# Altium schematic symbol library jlcpcb_2025_04_capacitors_extended_0805.schlib: 3281 symbols (part 6 of 18) (continued)
## C0805N121J251T
designator C?  Capacitance: 120pF  (hidden comment: *)
Capacitor, Ceramic (MLCC), 120pF, ±5%, 250V, NP0, ±5%, SMD 0805; Manufacturer: IHHEC(HOLY STONE ENTERPRISE CO., LTD); Manufacturer Part Number: C0805N121J251T; Package Size: 0805; JLCPCB Basic Part: No; JLCPCB Part Number: C105919; Supplier 1: LCSC; Category: Capacitors - MLCC; Supplier Part Number 1: C105919; Tolerance: ±5%; Voltage Rating: 250V; Temperature Coefficient: NP0; RoHS: Yes; ComponentLink1Description: Datasheet; ComponentLink1URL: https://wmsc.lcsc.com/wmsc/upload/file/pdf/v2/lcsc/2304140030_IHHEC-HOLY-STONE-ENTERPRISE-CO---LTD-C0805N121J251T_C105919.pdf; ComponentLink2Description: JLCPCB Part URL; ComponentLink2URL: https://jlcpcb.com/partdetail/C105919; ComponentLink3Description: LCSC Part URL; ComponentLink3URL: https://lcsc.com/product-detail/Multilayer-Ceramic-Capacitors-MLCC---SMD-SMT_IHHECHOLY-STONE-ENTERPRISE-CO.%2C-LTD-IHHECHOLY-STONE-ENTERPRISE-CO.%2C-LTD-C0805N121J251T_C105919.html
footprint CAP-0805 (0805 (2012M) Capacitor)
pins: 1, 2

## C0805N122J050T
designator C?  Capacitance: 1.2nF  (hidden comment: *)
Capacitor, Ceramic (MLCC), 1.2nF, ±5%, 50V, NP0, ±5%, SMD 0805; Manufacturer: IHHEC(HOLY STONE ENTERPRISE CO., LTD); Manufacturer Part Number: C0805N122J050T; Package Size: 0805; JLCPCB Basic Part: No; JLCPCB Part Number: C105920; Supplier 1: LCSC; Category: Capacitors - MLCC; Supplier Part Number 1: C105920; Tolerance: ±5%; Voltage Rating: 50V; Temperature Coefficient: NP0; RoHS: Yes; ComponentLink1Description: Datasheet; ComponentLink1URL: https://wmsc.lcsc.com/wmsc/upload/file/pdf/v2/lcsc/2304140030_IHHEC-HOLY-STONE-ENTERPRISE-CO---LTD-C0805N122J050T_C105920.pdf; ComponentLink2Description: JLCPCB Part URL; ComponentLink2URL: https://jlcpcb.com/partdetail/C105920; ComponentLink3Description: LCSC Part URL; ComponentLink3URL: https://lcsc.com/product-detail/Multilayer-Ceramic-Capacitors-MLCC---SMD-SMT_IHHECHOLY-STONE-ENTERPRISE-CO.%2C-LTD-IHHECHOLY-STONE-ENTERPRISE-CO.%2C-LTD-C0805N122J050T_C105920.html
footprint CAP-0805 (0805 (2012M) Capacitor)
pins: 1, 2

## C0805N151J101T
designator C?  Capacitance: 150pF  (hidden comment: *)
Capacitor, Ceramic (MLCC), 150pF, ±5%, 100V, NP0, ±5%, SMD 0805; Manufacturer: IHHEC(HOLY STONE ENTERPRISE CO., LTD); Manufacturer Part Number: C0805N151J101T; Package Size: 0805; JLCPCB Basic Part: No; JLCPCB Part Number: C105921; Supplier 1: LCSC; Category: Capacitors - MLCC; Supplier Part Number 1: C105921; Tolerance: ±5%; Voltage Rating: 100V; Temperature Coefficient: NP0; RoHS: Yes; ComponentLink1Description: Datasheet; ComponentLink1URL: https://wmsc.lcsc.com/wmsc/upload/file/pdf/v2/lcsc/2304140030_IHHEC-HOLY-STONE-ENTERPRISE-CO---LTD-C0805N151J101T_C105921.pdf; ComponentLink2Description: JLCPCB Part URL; ComponentLink2URL: https://jlcpcb.com/partdetail/C105921; ComponentLink3Description: LCSC Part URL; ComponentLink3URL: https://lcsc.com/product-detail/Multilayer-Ceramic-Capacitors-MLCC---SMD-SMT_IHHECHOLY-STONE-ENTERPRISE-CO.%2C-LTD-IHHECHOLY-STONE-ENTERPRISE-CO.%2C-LTD-C0805N151J101T_C105921.html
footprint CAP-0805 (0805 (2012M) Capacitor)
pins: 1, 2

## C0805N152J050T
designator C?  Capacitance: 1.5nF  (hidden comment: *)
Capacitor, Ceramic (MLCC), 1.5nF, ±5%, 50V, NP0, ±5%, SMD 0805; Manufacturer: IHHEC(HOLY STONE ENTERPRISE CO., LTD); Manufacturer Part Number: C0805N152J050T; Package Size: 0805; JLCPCB Basic Part: No; JLCPCB Part Number: C105922; Supplier 1: LCSC; Category: Capacitors - MLCC; Supplier Part Number 1: C105922; Tolerance: ±5%; Voltage Rating: 50V; Temperature Coefficient: NP0; RoHS: Yes; ComponentLink1Description: Datasheet; ComponentLink1URL: https://wmsc.lcsc.com/wmsc/upload/file/pdf/v2/lcsc/2304140030_IHHEC-HOLY-STONE-ENTERPRISE-CO---LTD-C0805N152J050T_C105922.pdf; ComponentLink2Description: JLCPCB Part URL; ComponentLink2URL: https://jlcpcb.com/partdetail/C105922; ComponentLink3Description: LCSC Part URL; ComponentLink3URL: https://lcsc.com/product-detail/Multilayer-Ceramic-Capacitors-MLCC---SMD-SMT_IHHECHOLY-STONE-ENTERPRISE-CO.%2C-LTD-IHHECHOLY-STONE-ENTERPRISE-CO.%2C-LTD-C0805N152J050T_C105922.html
footprint CAP-0805 (0805 (2012M) Capacitor)
pins: 1, 2

## C0805N182J050T
designator C?  Capacitance: 1.8nF  (hidden comment: *)
Capacitor, Ceramic (MLCC), 1.8nF, ±5%, 50V, NP0, ±5%, SMD 0805; Manufacturer: IHHEC(HOLY STONE ENTERPRISE CO., LTD); Manufacturer Part Number: C0805N182J050T; Package Size: 0805; JLCPCB Basic Part: No; JLCPCB Part Number: C105923; Supplier 1: LCSC; Category: Capacitors - MLCC; Supplier Part Number 1: C105923; Tolerance: ±5%; Voltage Rating: 50V; Temperature Coefficient: NP0; RoHS: Yes; ComponentLink1Description: Datasheet; ComponentLink1URL: https://wmsc.lcsc.com/wmsc/upload/file/pdf/v2/lcsc/2304140030_IHHEC-HOLY-STONE-ENTERPRISE-CO---LTD-C0805N182J050T_C105923.pdf; ComponentLink2Description: JLCPCB Part URL; ComponentLink2URL: https://jlcpcb.com/partdetail/C105923; ComponentLink3Description: LCSC Part URL; ComponentLink3URL: https://lcsc.com/product-detail/Multilayer-Ceramic-Capacitors-MLCC---SMD-SMT_IHHECHOLY-STONE-ENTERPRISE-CO.%2C-LTD-IHHECHOLY-STONE-ENTERPRISE-CO.%2C-LTD-C0805N182J050T_C105923.html
footprint CAP-0805 (0805 (2012M) Capacitor)
pins: 1, 2

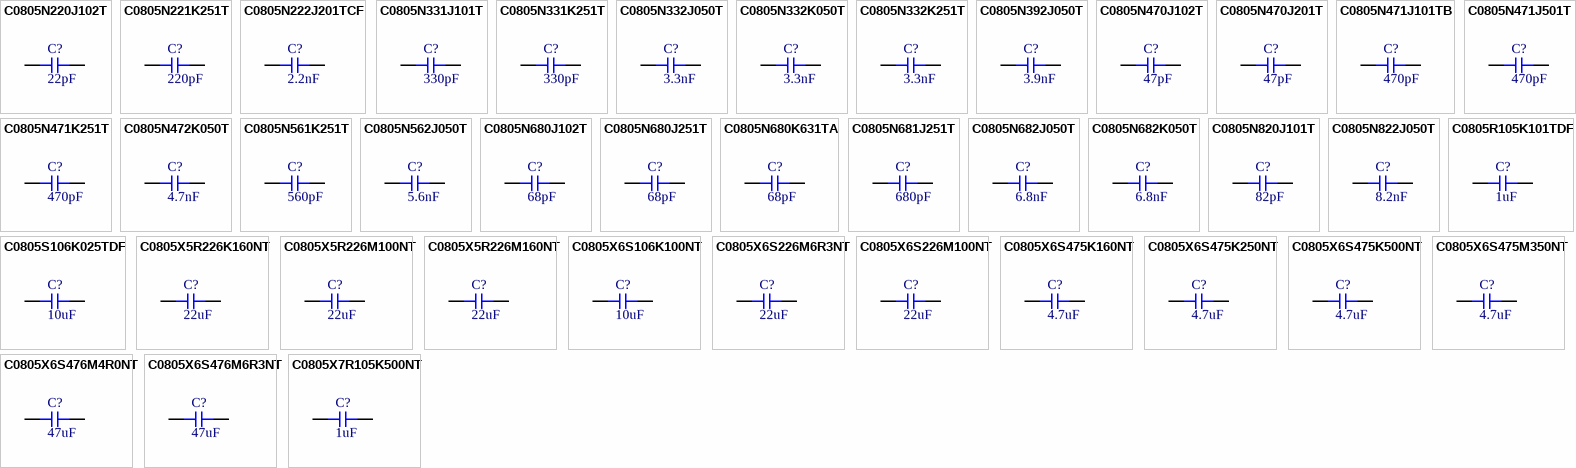
[diagram p24: symbols C0805N220J102T to C0805X7R105K500NT]

## C0805N220J102T
designator C?  Capacitance: 22pF  (hidden comment: *)
Capacitor, Ceramic (MLCC), 22pF, 1kV, NP0, SMD 0805; Manufacturer: IHHEC(HOLY STONE ENTERPRISE CO., LTD); Manufacturer Part Number: C0805N220J102T; Package Size: 0805; JLCPCB Basic Part: No; JLCPCB Part Number: C2915747; Supplier 1: LCSC; Category: Capacitors - MLCC; Supplier Part Number 1: C2915747; Voltage Rating: 1kV; Temperature Coefficient: NP0; RoHS: Yes; ComponentLink1Description: Datasheet; ComponentLink1URL: https://wmsc.lcsc.com/wmsc/upload/file/pdf/v2/lcsc/2111172030_IHHEC-HOLY-STONE-ENTERPRISE-CO---LTD-C0805N220J102T_C2915747.pdf; ComponentLink2Description: JLCPCB Part URL; ComponentLink2URL: https://jlcpcb.com/partdetail/C2915747; ComponentLink3Description: LCSC Part URL; ComponentLink3URL: https://lcsc.com/product-detail/Multilayer-Ceramic-Capacitors-MLCC---SMD-SMT_IHHECHOLY-STONE-ENTERPRISE-CO.%2C-LTD-IHHECHOLY-STONE-ENTERPRISE-CO.%2C-LTD-C0805N220J102T_C2915747.html
footprint CAP-0805 (0805 (2012M) Capacitor)
pins: 1, 2

## C0805N221K251T
designator C?  Capacitance: 220pF  (hidden comment: *)
Capacitor, Ceramic (MLCC), 220pF, ±10%, 250V, NP0, ±10%, SMD 0805; Manufacturer: IHHEC(HOLY STONE ENTERPRISE CO., LTD); Manufacturer Part Number: C0805N221K251T; Package Size: 0805; JLCPCB Basic Part: No; JLCPCB Part Number: C105924; Supplier 1: LCSC; Category: Capacitors - MLCC; Supplier Part Number 1: C105924; Tolerance: ±10%; Voltage Rating: 250V; Temperature Coefficient: NP0; RoHS: Yes; ComponentLink1Description: Datasheet; ComponentLink1URL: https://wmsc.lcsc.com/wmsc/upload/file/pdf/v2/lcsc/2304140030_IHHEC-HOLY-STONE-ENTERPRISE-CO---LTD-C0805N221K251T_C105924.pdf; ComponentLink2Description: JLCPCB Part URL; ComponentLink2URL: https://jlcpcb.com/partdetail/C105924; ComponentLink3Description: LCSC Part URL; ComponentLink3URL: https://lcsc.com/product-detail/Multilayer-Ceramic-Capacitors-MLCC---SMD-SMT_IHHECHOLY-STONE-ENTERPRISE-CO.%2C-LTD-IHHECHOLY-STONE-ENTERPRISE-CO.%2C-LTD-C0805N221K251T_C105924.html
footprint CAP-0805 (0805 (2012M) Capacitor)
pins: 1, 2

## C0805N222J201TCF
designator C?  Capacitance: 2.2nF  (hidden comment: *)
Capacitor, Ceramic (MLCC), 2.2nF, ±5%, 200V, NP0, ±5%, SMD 0805; Manufacturer: IHHEC(HOLY STONE ENTERPRISE CO., LTD); Manufacturer Part Number: C0805N222J201TCF; Package Size: 0805; JLCPCB Basic Part: No; JLCPCB Part Number: C2991898; Supplier 1: LCSC; Category: Capacitors - MLCC; Supplier Part Number 1: C2991898; Tolerance: ±5%; Voltage Rating: 200V; Temperature Coefficient: NP0; RoHS: Yes; ComponentLink1Description: Datasheet; ComponentLink1URL: https://wmsc.lcsc.com/wmsc/upload/file/pdf/v2/lcsc/2204131745_IHHEC-HOLY-STONE-ENTERPRISE-CO---LTD-C0805N222J201TCF_C2991898.pdf; ComponentLink2Description: JLCPCB Part URL; ComponentLink2URL: https://jlcpcb.com/partdetail/C2991898; ComponentLink3Description: LCSC Part URL; ComponentLink3URL: https://lcsc.com/product-detail/Multilayer-Ceramic-Capacitors-MLCC---SMD-SMT_IHHECHOLY-STONE-ENTERPRISE-CO.%2C-LTD-IHHECHOLY-STONE-ENTERPRISE-CO.%2C-LTD-C0805N222J201TCF_C2991898.html
footprint CAP-0805 (0805 (2012M) Capacitor)
pins: 1, 2

## C0805N331J101T
designator C?  Capacitance: 330pF  (hidden comment: *)
Capacitor, Ceramic (MLCC), 330pF, ±5%, 100V, NP0, ±5%, SMD 0805; Manufacturer: IHHEC(HOLY STONE ENTERPRISE CO., LTD); Manufacturer Part Number: C0805N331J101T; Package Size: 0805; JLCPCB Basic Part: No; JLCPCB Part Number: C105926; Supplier 1: LCSC; Category: Capacitors - MLCC; Supplier Part Number 1: C105926; Tolerance: ±5%; Voltage Rating: 100V; Temperature Coefficient: NP0; RoHS: Yes; ComponentLink1Description: Datasheet; ComponentLink1URL: https://wmsc.lcsc.com/wmsc/upload/file/pdf/v2/lcsc/2304140030_IHHEC-HOLY-STONE-ENTERPRISE-CO---LTD-C0805N331J101T_C105926.pdf; ComponentLink2Description: JLCPCB Part URL; ComponentLink2URL: https://jlcpcb.com/partdetail/C105926; ComponentLink3Description: LCSC Part URL; ComponentLink3URL: https://lcsc.com/product-detail/Multilayer-Ceramic-Capacitors-MLCC---SMD-SMT_IHHECHOLY-STONE-ENTERPRISE-CO.%2C-LTD-IHHECHOLY-STONE-ENTERPRISE-CO.%2C-LTD-C0805N331J101T_C105926.html
footprint CAP-0805 (0805 (2012M) Capacitor)
pins: 1, 2

## C0805N331K251T
designator C?  Capacitance: 330pF  (hidden comment: *)
Capacitor, Ceramic (MLCC), 330pF, ±10%, 250V, NP0, ±10%, SMD 0805; Manufacturer: IHHEC(HOLY STONE ENTERPRISE CO., LTD); Manufacturer Part Number: C0805N331K251T; Package Size: 0805; JLCPCB Basic Part: No; JLCPCB Part Number: C105927; Supplier 1: LCSC; Category: Capacitors - MLCC; Supplier Part Number 1: C105927; Tolerance: ±10%; Voltage Rating: 250V; Temperature Coefficient: NP0; RoHS: Yes; ComponentLink1Description: Datasheet; ComponentLink1URL: https://wmsc.lcsc.com/wmsc/upload/file/pdf/v2/lcsc/2304140030_IHHEC-HOLY-STONE-ENTERPRISE-CO---LTD-C0805N331K251T_C105927.pdf; ComponentLink2Description: JLCPCB Part URL; ComponentLink2URL: https://jlcpcb.com/partdetail/C105927; ComponentLink3Description: LCSC Part URL; ComponentLink3URL: https://lcsc.com/product-detail/Multilayer-Ceramic-Capacitors-MLCC---SMD-SMT_IHHECHOLY-STONE-ENTERPRISE-CO.%2C-LTD-IHHECHOLY-STONE-ENTERPRISE-CO.%2C-LTD-C0805N331K251T_C105927.html
footprint CAP-0805 (0805 (2012M) Capacitor)
pins: 1, 2

## C0805N332J050T
designator C?  Capacitance: 3.3nF  (hidden comment: *)
Capacitor, Ceramic (MLCC), 3.3nF, ±5%, 50V, NP0, ±5%, SMD 0805; Manufacturer: IHHEC(HOLY STONE ENTERPRISE CO., LTD); Manufacturer Part Number: C0805N332J050T; Package Size: 0805; JLCPCB Basic Part: No; JLCPCB Part Number: C105928; Supplier 1: LCSC; Category: Capacitors - MLCC; Supplier Part Number 1: C105928; Tolerance: ±5%; Voltage Rating: 50V; Temperature Coefficient: NP0; RoHS: Yes; ComponentLink1Description: Datasheet; ComponentLink1URL: https://wmsc.lcsc.com/wmsc/upload/file/pdf/v2/lcsc/2304140030_IHHEC-HOLY-STONE-ENTERPRISE-CO---LTD-C0805N332J050T_C105928.pdf; ComponentLink2Description: JLCPCB Part URL; ComponentLink2URL: https://jlcpcb.com/partdetail/C105928; ComponentLink3Description: LCSC Part URL; ComponentLink3URL: https://lcsc.com/product-detail/Multilayer-Ceramic-Capacitors-MLCC---SMD-SMT_IHHECHOLY-STONE-ENTERPRISE-CO.%2C-LTD-IHHECHOLY-STONE-ENTERPRISE-CO.%2C-LTD-C0805N332J050T_C105928.html
footprint CAP-0805 (0805 (2012M) Capacitor)
pins: 1, 2

## C0805N332K050T
designator C?  Capacitance: 3.3nF  (hidden comment: *)
Capacitor, Ceramic (MLCC), 3.3nF, ±10%, 50V, NP0, ±10%, SMD 0805; Manufacturer: IHHEC(HOLY STONE ENTERPRISE CO., LTD); Manufacturer Part Number: C0805N332K050T; Package Size: 0805; JLCPCB Basic Part: No; JLCPCB Part Number: C105929; Supplier 1: LCSC; Category: Capacitors - MLCC; Supplier Part Number 1: C105929; Tolerance: ±10%; Voltage Rating: 50V; Temperature Coefficient: NP0; RoHS: Yes; ComponentLink1Description: Datasheet; ComponentLink1URL: https://wmsc.lcsc.com/wmsc/upload/file/pdf/v2/lcsc/2304140030_IHHEC-HOLY-STONE-ENTERPRISE-CO---LTD-C0805N332K050T_C105929.pdf; ComponentLink2Description: JLCPCB Part URL; ComponentLink2URL: https://jlcpcb.com/partdetail/C105929; ComponentLink3Description: LCSC Part URL; ComponentLink3URL: https://lcsc.com/product-detail/Multilayer-Ceramic-Capacitors-MLCC---SMD-SMT_IHHECHOLY-STONE-ENTERPRISE-CO.%2C-LTD-IHHECHOLY-STONE-ENTERPRISE-CO.%2C-LTD-C0805N332K050T_C105929.html
footprint CAP-0805 (0805 (2012M) Capacitor)
pins: 1, 2

## C0805N332K251T
designator C?  Capacitance: 3.3nF  (hidden comment: *)
Capacitor, Ceramic (MLCC), 3.3nF, ±10%, 250V, NP0, ±10%, SMD 0805; Manufacturer: IHHEC(HOLY STONE ENTERPRISE CO., LTD); Manufacturer Part Number: C0805N332K251T; Package Size: 0805; JLCPCB Basic Part: No; JLCPCB Part Number: C105930; Supplier 1: LCSC; Category: Capacitors - MLCC; Supplier Part Number 1: C105930; Tolerance: ±10%; Voltage Rating: 250V; Temperature Coefficient: NP0; RoHS: Yes; ComponentLink1Description: Datasheet; ComponentLink1URL: https://wmsc.lcsc.com/wmsc/upload/file/pdf/v2/lcsc/2304140030_IHHEC-HOLY-STONE-ENTERPRISE-CO---LTD-C0805N332K251T_C105930.pdf; ComponentLink2Description: JLCPCB Part URL; ComponentLink2URL: https://jlcpcb.com/partdetail/C105930; ComponentLink3Description: LCSC Part URL; ComponentLink3URL: https://lcsc.com/product-detail/Multilayer-Ceramic-Capacitors-MLCC---SMD-SMT_IHHECHOLY-STONE-ENTERPRISE-CO.%2C-LTD-IHHECHOLY-STONE-ENTERPRISE-CO.%2C-LTD-C0805N332K251T_C105930.html
footprint CAP-0805 (0805 (2012M) Capacitor)
pins: 1, 2

## C0805N392J050T
designator C?  Capacitance: 3.9nF  (hidden comment: *)
Capacitor, Ceramic (MLCC), 3.9nF, ±5%, 50V, NP0, ±5%, SMD 0805; Manufacturer: IHHEC(HOLY STONE ENTERPRISE CO., LTD); Manufacturer Part Number: C0805N392J050T; Package Size: 0805; JLCPCB Basic Part: No; JLCPCB Part Number: C105931; Supplier 1: LCSC; Category: Capacitors - MLCC; Supplier Part Number 1: C105931; Tolerance: ±5%; Voltage Rating: 50V; Temperature Coefficient: NP0; RoHS: Yes; ComponentLink1Description: Datasheet; ComponentLink1URL: https://wmsc.lcsc.com/wmsc/upload/file/pdf/v2/lcsc/2304140030_IHHEC-HOLY-STONE-ENTERPRISE-CO---LTD-C0805N392J050T_C105931.pdf; ComponentLink2Description: JLCPCB Part URL; ComponentLink2URL: https://jlcpcb.com/partdetail/C105931; ComponentLink3Description: LCSC Part URL; ComponentLink3URL: https://lcsc.com/product-detail/Multilayer-Ceramic-Capacitors-MLCC---SMD-SMT_IHHECHOLY-STONE-ENTERPRISE-CO.%2C-LTD-IHHECHOLY-STONE-ENTERPRISE-CO.%2C-LTD-C0805N392J050T_C105931.html
footprint CAP-0805 (0805 (2012M) Capacitor)
pins: 1, 2

## C0805N470J102T
designator C?  Capacitance: 47pF  (hidden comment: *)
Capacitor, Ceramic (MLCC), 47pF, 1kV, NP0, SMD 0805; Manufacturer: IHHEC(HOLY STONE ENTERPRISE CO., LTD); Manufacturer Part Number: C0805N470J102T; Package Size: 0805; JLCPCB Basic Part: No; JLCPCB Part Number: C2940746; Supplier 1: LCSC; Category: Capacitors - MLCC; Supplier Part Number 1: C2940746; Voltage Rating: 1kV; Temperature Coefficient: NP0; RoHS: Yes; ComponentLink1Description: Datasheet; ComponentLink1URL: https://wmsc.lcsc.com/wmsc/upload/file/pdf/v2/lcsc/2201121900_IHHEC-HOLY-STONE-ENTERPRISE-CO---LTD-C0805N470J102T_C2940746.pdf; ComponentLink2Description: JLCPCB Part URL; ComponentLink2URL: https://jlcpcb.com/partdetail/C2940746; ComponentLink3Description: LCSC Part URL; ComponentLink3URL: https://lcsc.com/product-detail/Multilayer-Ceramic-Capacitors-MLCC---SMD-SMT_IHHECHOLY-STONE-ENTERPRISE-CO.%2C-LTD-IHHECHOLY-STONE-ENTERPRISE-CO.%2C-LTD-C0805N470J102T_C2940746.html
footprint CAP-0805 (0805 (2012M) Capacitor)
pins: 1, 2

## C0805N470J201T
designator C?  Capacitance: 47pF  (hidden comment: *)
Capacitor, Ceramic (MLCC), 47pF, ±5%, 200V, NP0, ±5%, SMD 0805; Manufacturer: IHHEC(HOLY STONE ENTERPRISE CO., LTD); Manufacturer Part Number: C0805N470J201T; Package Size: 0805; JLCPCB Basic Part: No; JLCPCB Part Number: C105932; Supplier 1: LCSC; Category: Capacitors - MLCC; Supplier Part Number 1: C105932; Tolerance: ±5%; Voltage Rating: 200V; Temperature Coefficient: NP0; RoHS: Yes; ComponentLink1Description: Datasheet; ComponentLink1URL: https://wmsc.lcsc.com/wmsc/upload/file/pdf/v2/lcsc/2304140030_IHHEC-HOLY-STONE-ENTERPRISE-CO---LTD-C0805N470J201T_C105932.pdf; ComponentLink2Description: JLCPCB Part URL; ComponentLink2URL: https://jlcpcb.com/partdetail/C105932; ComponentLink3Description: LCSC Part URL; ComponentLink3URL: https://lcsc.com/product-detail/Multilayer-Ceramic-Capacitors-MLCC---SMD-SMT_IHHECHOLY-STONE-ENTERPRISE-CO.%2C-LTD-IHHECHOLY-STONE-ENTERPRISE-CO.%2C-LTD-C0805N470J201T_C105932.html
footprint CAP-0805 (0805 (2012M) Capacitor)
pins: 1, 2

## C0805N471J101TB
designator C?  Capacitance: 470pF  (hidden comment: *)
Capacitor, Ceramic (MLCC), 470pF, ±5%, 100V, NP0, ±5%, SMD 0805; Manufacturer: IHHEC(HOLY STONE ENTERPRISE CO., LTD); Manufacturer Part Number: C0805N471J101TB; Package Size: 0805; JLCPCB Basic Part: No; JLCPCB Part Number: C340302; Supplier 1: LCSC; Category: Capacitors - MLCC; Supplier Part Number 1: C340302; Tolerance: ±5%; Voltage Rating: 100V; Temperature Coefficient: NP0; RoHS: Yes; ComponentLink1Description: Datasheet; ComponentLink1URL: https://wmsc.lcsc.com/wmsc/upload/file/pdf/v2/lcsc/2304140030_IHHEC-HOLY-STONE-ENTERPRISE-CO---LTD-C0805N471J101TB_C340302.pdf; ComponentLink2Description: JLCPCB Part URL; ComponentLink2URL: https://jlcpcb.com/partdetail/C340302; ComponentLink3Description: LCSC Part URL; ComponentLink3URL: https://lcsc.com/product-detail/Multilayer-Ceramic-Capacitors-MLCC---SMD-SMT_IHHECHOLY-STONE-ENTERPRISE-CO.%2C-LTD-IHHECHOLY-STONE-ENTERPRISE-CO.%2C-LTD-C0805N471J101TB_C340302.html
footprint CAP-0805 (0805 (2012M) Capacitor)
pins: 1, 2

## C0805N471J501T
designator C?  Capacitance: 470pF  (hidden comment: *)
Capacitor, Ceramic (MLCC), 470pF, ±5%, 500V, NP0, ±5%, SMD 0805; Manufacturer: IHHEC(HOLY STONE ENTERPRISE CO., LTD); Manufacturer Part Number: C0805N471J501T; Package Size: 0805; JLCPCB Basic Part: No; JLCPCB Part Number: C105933; Supplier 1: LCSC; Category: Capacitors - MLCC; Supplier Part Number 1: C105933; Tolerance: ±5%; Voltage Rating: 500V; Temperature Coefficient: NP0; RoHS: Yes; ComponentLink1Description: Datasheet; ComponentLink1URL: https://wmsc.lcsc.com/wmsc/upload/file/pdf/v2/lcsc/2304140030_IHHEC-HOLY-STONE-ENTERPRISE-CO---LTD-C0805N471J501T_C105933.pdf; ComponentLink2Description: JLCPCB Part URL; ComponentLink2URL: https://jlcpcb.com/partdetail/C105933; ComponentLink3Description: LCSC Part URL; ComponentLink3URL: https://lcsc.com/product-detail/Multilayer-Ceramic-Capacitors-MLCC---SMD-SMT_IHHECHOLY-STONE-ENTERPRISE-CO.%2C-LTD-IHHECHOLY-STONE-ENTERPRISE-CO.%2C-LTD-C0805N471J501T_C105933.html
footprint CAP-0805 (0805 (2012M) Capacitor)
pins: 1, 2

## C0805N471K251T
designator C?  Capacitance: 470pF  (hidden comment: *)
Capacitor, Ceramic (MLCC), 470pF, ±10%, 250V, NP0, ±10%, SMD 0805; Manufacturer: IHHEC(HOLY STONE ENTERPRISE CO., LTD); Manufacturer Part Number: C0805N471K251T; Package Size: 0805; JLCPCB Basic Part: No; JLCPCB Part Number: C105934; Supplier 1: LCSC; Category: Capacitors - MLCC; Supplier Part Number 1: C105934; Tolerance: ±10%; Voltage Rating: 250V; Temperature Coefficient: NP0; RoHS: Yes; ComponentLink1Description: Datasheet; ComponentLink1URL: https://wmsc.lcsc.com/wmsc/upload/file/pdf/v2/lcsc/2304140030_IHHEC-HOLY-STONE-ENTERPRISE-CO---LTD-C0805N471K251T_C105934.pdf; ComponentLink2Description: JLCPCB Part URL; ComponentLink2URL: https://jlcpcb.com/partdetail/C105934; ComponentLink3Description: LCSC Part URL; ComponentLink3URL: https://lcsc.com/product-detail/Multilayer-Ceramic-Capacitors-MLCC---SMD-SMT_IHHECHOLY-STONE-ENTERPRISE-CO.%2C-LTD-IHHECHOLY-STONE-ENTERPRISE-CO.%2C-LTD-C0805N471K251T_C105934.html
footprint CAP-0805 (0805 (2012M) Capacitor)
pins: 1, 2

## C0805N472K050T
designator C?  Capacitance: 4.7nF  (hidden comment: *)
Capacitor, Ceramic (MLCC), 4.7nF, ±10%, 50V, NP0, ±10%, SMD 0805; Manufacturer: IHHEC(HOLY STONE ENTERPRISE CO., LTD); Manufacturer Part Number: C0805N472K050T; Package Size: 0805; JLCPCB Basic Part: No; JLCPCB Part Number: C105936; Supplier 1: LCSC; Category: Capacitors - MLCC; Supplier Part Number 1: C105936; Tolerance: ±10%; Voltage Rating: 50V; Temperature Coefficient: NP0; RoHS: Yes; ComponentLink1Description: Datasheet; ComponentLink1URL: https://wmsc.lcsc.com/wmsc/upload/file/pdf/v2/lcsc/2304140030_IHHEC-HOLY-STONE-ENTERPRISE-CO---LTD-C0805N472K050T_C105936.pdf; ComponentLink2Description: JLCPCB Part URL; ComponentLink2URL: https://jlcpcb.com/partdetail/C105936; ComponentLink3Description: LCSC Part URL; ComponentLink3URL: https://lcsc.com/product-detail/Multilayer-Ceramic-Capacitors-MLCC---SMD-SMT_IHHECHOLY-STONE-ENTERPRISE-CO.%2C-LTD-IHHECHOLY-STONE-ENTERPRISE-CO.%2C-LTD-C0805N472K050T_C105936.html
footprint CAP-0805 (0805 (2012M) Capacitor)
pins: 1, 2

## C0805N561K251T
designator C?  Capacitance: 560pF  (hidden comment: *)
Capacitor, Ceramic (MLCC), 560pF, ±10%, 250V, NP0, ±10%, SMD 0805; Manufacturer: IHHEC(HOLY STONE ENTERPRISE CO., LTD); Manufacturer Part Number: C0805N561K251T; Package Size: 0805; JLCPCB Basic Part: No; JLCPCB Part Number: C105937; Supplier 1: LCSC; Category: Capacitors - MLCC; Supplier Part Number 1: C105937; Tolerance: ±10%; Voltage Rating: 250V; Temperature Coefficient: NP0; RoHS: Yes; ComponentLink1Description: Datasheet; ComponentLink1URL: https://wmsc.lcsc.com/wmsc/upload/file/pdf/v2/lcsc/2304140030_IHHEC-HOLY-STONE-ENTERPRISE-CO---LTD-C0805N561K251T_C105937.pdf; ComponentLink2Description: JLCPCB Part URL; ComponentLink2URL: https://jlcpcb.com/partdetail/C105937; ComponentLink3Description: LCSC Part URL; ComponentLink3URL: https://lcsc.com/product-detail/Multilayer-Ceramic-Capacitors-MLCC---SMD-SMT_IHHECHOLY-STONE-ENTERPRISE-CO.%2C-LTD-IHHECHOLY-STONE-ENTERPRISE-CO.%2C-LTD-C0805N561K251T_C105937.html
footprint CAP-0805 (0805 (2012M) Capacitor)
pins: 1, 2

## C0805N562J050T
designator C?  Capacitance: 5.6nF  (hidden comment: *)
Capacitor, Ceramic (MLCC), 5.6nF, ±5%, 50V, NP0, ±5%, SMD 0805; Manufacturer: IHHEC(HOLY STONE ENTERPRISE CO., LTD); Manufacturer Part Number: C0805N562J050T; Package Size: 0805; JLCPCB Basic Part: No; JLCPCB Part Number: C105938; Supplier 1: LCSC; Category: Capacitors - MLCC; Supplier Part Number 1: C105938; Tolerance: ±5%; Voltage Rating: 50V; Temperature Coefficient: NP0; RoHS: Yes; ComponentLink1Description: Datasheet; ComponentLink1URL: https://wmsc.lcsc.com/wmsc/upload/file/pdf/v2/lcsc/2304140030_IHHEC-HOLY-STONE-ENTERPRISE-CO---LTD-C0805N562J050T_C105938.pdf; ComponentLink2Description: JLCPCB Part URL; ComponentLink2URL: https://jlcpcb.com/partdetail/C105938; ComponentLink3Description: LCSC Part URL; ComponentLink3URL: https://lcsc.com/product-detail/Multilayer-Ceramic-Capacitors-MLCC---SMD-SMT_IHHECHOLY-STONE-ENTERPRISE-CO.%2C-LTD-IHHECHOLY-STONE-ENTERPRISE-CO.%2C-LTD-C0805N562J050T_C105938.html
footprint CAP-0805 (0805 (2012M) Capacitor)
pins: 1, 2

## C0805N680J102T
designator C?  Capacitance: 68pF  (hidden comment: *)
Capacitor, Ceramic (MLCC), 68pF, 1kV, NP0, SMD 0805; Manufacturer: IHHEC(HOLY STONE ENTERPRISE CO., LTD); Manufacturer Part Number: C0805N680J102T; Package Size: 0805; JLCPCB Basic Part: No; JLCPCB Part Number: C2998550; Supplier 1: LCSC; Category: Capacitors - MLCC; Supplier Part Number 1: C2998550; Voltage Rating: 1kV; Temperature Coefficient: NP0; RoHS: Yes; ComponentLink1Description: Datasheet; ComponentLink1URL: https://wmsc.lcsc.com/wmsc/upload/file/pdf/v2/lcsc/2205051716_IHHEC-HOLY-STONE-ENTERPRISE-CO---LTD-C0805N680J102T_C2998550.pdf; ComponentLink2Description: JLCPCB Part URL; ComponentLink2URL: https://jlcpcb.com/partdetail/C2998550; ComponentLink3Description: LCSC Part URL; ComponentLink3URL: https://lcsc.com/product-detail/Multilayer-Ceramic-Capacitors-MLCC---SMD-SMT_IHHECHOLY-STONE-ENTERPRISE-CO.%2C-LTD-IHHECHOLY-STONE-ENTERPRISE-CO.%2C-LTD-C0805N680J102T_C2998550.html
footprint CAP-0805 (0805 (2012M) Capacitor)
pins: 1, 2

## C0805N680J251T
designator C?  Capacitance: 68pF  (hidden comment: *)
Capacitor, Ceramic (MLCC), 68pF, ±5%, 250V, NP0, ±5%, SMD 0805; Manufacturer: IHHEC(HOLY STONE ENTERPRISE CO., LTD); Manufacturer Part Number: C0805N680J251T; Package Size: 0805; JLCPCB Basic Part: No; JLCPCB Part Number: C2998551; Supplier 1: LCSC; Category: Capacitors - MLCC; Supplier Part Number 1: C2998551; Tolerance: ±5%; Voltage Rating: 250V; Temperature Coefficient: NP0; RoHS: Yes; ComponentLink1Description: Datasheet; ComponentLink1URL: https://wmsc.lcsc.com/wmsc/upload/file/pdf/v2/lcsc/2205051716_IHHEC-HOLY-STONE-ENTERPRISE-CO---LTD-C0805N680J251T_C2998551.pdf; ComponentLink2Description: JLCPCB Part URL; ComponentLink2URL: https://jlcpcb.com/partdetail/C2998551; ComponentLink3Description: LCSC Part URL; ComponentLink3URL: https://lcsc.com/product-detail/Multilayer-Ceramic-Capacitors-MLCC---SMD-SMT_IHHECHOLY-STONE-ENTERPRISE-CO.%2C-LTD-IHHECHOLY-STONE-ENTERPRISE-CO.%2C-LTD-C0805N680J251T_C2998551.html
footprint CAP-0805 (0805 (2012M) Capacitor)
pins: 1, 2

## C0805N680K631TA
designator C?  Capacitance: 68pF  (hidden comment: *)
Capacitor, Ceramic (MLCC), 68pF, ±10%, 630V, NP0, ±10%, SMD 0805; Manufacturer: IHHEC(HOLY STONE ENTERPRISE CO., LTD); Manufacturer Part Number: C0805N680K631TA; Package Size: 0805; JLCPCB Basic Part: No; JLCPCB Part Number: C961512; Supplier 1: LCSC; Category: Capacitors - MLCC; Supplier Part Number 1: C961512; Tolerance: ±10%; Voltage Rating: 630V; Temperature Coefficient: NP0; RoHS: Yes; ComponentLink1Description: Datasheet; ComponentLink1URL: https://wmsc.lcsc.com/wmsc/upload/file/pdf/v2/lcsc/2304140030_IHHEC-HOLY-STONE-ENTERPRISE-CO---LTD-C0805N680K631TA_C961512.pdf; ComponentLink2Description: JLCPCB Part URL; ComponentLink2URL: https://jlcpcb.com/partdetail/C961512; ComponentLink3Description: LCSC Part URL; ComponentLink3URL: https://lcsc.com/product-detail/Multilayer-Ceramic-Capacitors-MLCC---SMD-SMT_IHHECHOLY-STONE-ENTERPRISE-CO.%2C-LTD-IHHECHOLY-STONE-ENTERPRISE-CO.%2C-LTD-C0805N680K631TA_C961512.html
footprint CAP-0805 (0805 (2012M) Capacitor)
pins: 1, 2

## C0805N681J251T
designator C?  Capacitance: 680pF  (hidden comment: *)
Capacitor, Ceramic (MLCC), 680pF, ±5%, 250V, NP0, ±5%, SMD 0805; Manufacturer: IHHEC(HOLY STONE ENTERPRISE CO., LTD); Manufacturer Part Number: C0805N681J251T; Package Size: 0805; JLCPCB Basic Part: No; JLCPCB Part Number: C105939; Supplier 1: LCSC; Category: Capacitors - MLCC; Supplier Part Number 1: C105939; Tolerance: ±5%; Voltage Rating: 250V; Temperature Coefficient: NP0; RoHS: Yes; ComponentLink1Description: Datasheet; ComponentLink1URL: https://wmsc.lcsc.com/wmsc/upload/file/pdf/v2/lcsc/2304140030_IHHEC-HOLY-STONE-ENTERPRISE-CO---LTD-C0805N681J251T_C105939.pdf; ComponentLink2Description: JLCPCB Part URL; ComponentLink2URL: https://jlcpcb.com/partdetail/C105939; ComponentLink3Description: LCSC Part URL; ComponentLink3URL: https://lcsc.com/product-detail/Multilayer-Ceramic-Capacitors-MLCC---SMD-SMT_IHHECHOLY-STONE-ENTERPRISE-CO.%2C-LTD-IHHECHOLY-STONE-ENTERPRISE-CO.%2C-LTD-C0805N681J251T_C105939.html
footprint CAP-0805 (0805 (2012M) Capacitor)
pins: 1, 2

## C0805N682J050T
designator C?  Capacitance: 6.8nF  (hidden comment: *)
Capacitor, Ceramic (MLCC), 6.8nF, ±5%, 50V, NP0, ±5%, SMD 0805; Manufacturer: IHHEC(HOLY STONE ENTERPRISE CO., LTD); Manufacturer Part Number: C0805N682J050T; Package Size: 0805; JLCPCB Basic Part: No; JLCPCB Part Number: C105940; Supplier 1: LCSC; Category: Capacitors - MLCC; Supplier Part Number 1: C105940; Tolerance: ±5%; Voltage Rating: 50V; Temperature Coefficient: NP0; RoHS: Yes; ComponentLink1Description: Datasheet; ComponentLink1URL: https://wmsc.lcsc.com/wmsc/upload/file/pdf/v2/lcsc/2304140030_IHHEC-HOLY-STONE-ENTERPRISE-CO---LTD-C0805N682J050T_C105940.pdf; ComponentLink2Description: JLCPCB Part URL; ComponentLink2URL: https://jlcpcb.com/partdetail/C105940; ComponentLink3Description: LCSC Part URL; ComponentLink3URL: https://lcsc.com/product-detail/Multilayer-Ceramic-Capacitors-MLCC---SMD-SMT_IHHECHOLY-STONE-ENTERPRISE-CO.%2C-LTD-IHHECHOLY-STONE-ENTERPRISE-CO.%2C-LTD-C0805N682J050T_C105940.html
footprint CAP-0805 (0805 (2012M) Capacitor)
pins: 1, 2

## C0805N682K050T
designator C?  Capacitance: 6.8nF  (hidden comment: *)
Capacitor, Ceramic (MLCC), 6.8nF, ±10%, 50V, NP0, ±10%, SMD 0805; Manufacturer: IHHEC(HOLY STONE ENTERPRISE CO., LTD); Manufacturer Part Number: C0805N682K050T; Package Size: 0805; JLCPCB Basic Part: No; JLCPCB Part Number: C105941; Supplier 1: LCSC; Category: Capacitors - MLCC; Supplier Part Number 1: C105941; Tolerance: ±10%; Voltage Rating: 50V; Temperature Coefficient: NP0; RoHS: Yes; ComponentLink1Description: Datasheet; ComponentLink1URL: https://wmsc.lcsc.com/wmsc/upload/file/pdf/v2/lcsc/2304140030_IHHEC-HOLY-STONE-ENTERPRISE-CO---LTD-C0805N682K050T_C105941.pdf; ComponentLink2Description: JLCPCB Part URL; ComponentLink2URL: https://jlcpcb.com/partdetail/C105941; ComponentLink3Description: LCSC Part URL; ComponentLink3URL: https://lcsc.com/product-detail/Multilayer-Ceramic-Capacitors-MLCC---SMD-SMT_IHHECHOLY-STONE-ENTERPRISE-CO.%2C-LTD-IHHECHOLY-STONE-ENTERPRISE-CO.%2C-LTD-C0805N682K050T_C105941.html
footprint CAP-0805 (0805 (2012M) Capacitor)
pins: 1, 2

## C0805N820J101T
designator C?  Capacitance: 82pF  (hidden comment: *)
Capacitor, Ceramic (MLCC), 82pF, ±5%, 100V, NP0, ±5%, SMD 0805; Manufacturer: IHHEC(HOLY STONE ENTERPRISE CO., LTD); Manufacturer Part Number: C0805N820J101T; Package Size: 0805; JLCPCB Basic Part: No; JLCPCB Part Number: C105942; Supplier 1: LCSC; Category: Capacitors - MLCC; Supplier Part Number 1: C105942; Tolerance: ±5%; Voltage Rating: 100V; Temperature Coefficient: NP0; RoHS: Yes; ComponentLink1Description: Datasheet; ComponentLink1URL: https://wmsc.lcsc.com/wmsc/upload/file/pdf/v2/lcsc/2304140030_IHHEC-HOLY-STONE-ENTERPRISE-CO---LTD-C0805N820J101T_C105942.pdf; ComponentLink2Description: JLCPCB Part URL; ComponentLink2URL: https://jlcpcb.com/partdetail/C105942; ComponentLink3Description: LCSC Part URL; ComponentLink3URL: https://lcsc.com/product-detail/Multilayer-Ceramic-Capacitors-MLCC---SMD-SMT_IHHECHOLY-STONE-ENTERPRISE-CO.%2C-LTD-IHHECHOLY-STONE-ENTERPRISE-CO.%2C-LTD-C0805N820J101T_C105942.html
footprint CAP-0805 (0805 (2012M) Capacitor)
pins: 1, 2

## C0805N822J050T
designator C?  Capacitance: 8.2nF  (hidden comment: *)
Capacitor, Ceramic (MLCC), 8.2nF, ±5%, 50V, NP0, ±5%, SMD 0805; Manufacturer: IHHEC(HOLY STONE ENTERPRISE CO., LTD); Manufacturer Part Number: C0805N822J050T; Package Size: 0805; JLCPCB Basic Part: No; JLCPCB Part Number: C105943; Supplier 1: LCSC; Category: Capacitors - MLCC; Supplier Part Number 1: C105943; Tolerance: ±5%; Voltage Rating: 50V; Temperature Coefficient: NP0; RoHS: Yes; ComponentLink1Description: Datasheet; ComponentLink1URL: https://wmsc.lcsc.com/wmsc/upload/file/pdf/v2/lcsc/2304140030_IHHEC-HOLY-STONE-ENTERPRISE-CO---LTD-C0805N822J050T_C105943.pdf; ComponentLink2Description: JLCPCB Part URL; ComponentLink2URL: https://jlcpcb.com/partdetail/C105943; ComponentLink3Description: LCSC Part URL; ComponentLink3URL: https://lcsc.com/product-detail/Multilayer-Ceramic-Capacitors-MLCC---SMD-SMT_IHHECHOLY-STONE-ENTERPRISE-CO.%2C-LTD-IHHECHOLY-STONE-ENTERPRISE-CO.%2C-LTD-C0805N822J050T_C105943.html
footprint CAP-0805 (0805 (2012M) Capacitor)
pins: 1, 2

## C0805R105K101TDF
designator C?  Capacitance: 1uF  (hidden comment: *)
Capacitor, Ceramic (MLCC), 1uF, ±10%, 100V, X7S, ±10%, SMD 0805; Manufacturer: IHHEC(HOLY STONE ENTERPRISE CO., LTD); Manufacturer Part Number: C0805R105K101TDF; Package Size: 0805; JLCPCB Basic Part: No; JLCPCB Part Number: C2991905; Supplier 1: LCSC; Category: Capacitors - MLCC; Supplier Part Number 1: C2991905; Tolerance: ±10%; Voltage Rating: 100V; Temperature Coefficient: X7S; RoHS: Yes; ComponentLink1Description: Datasheet; ComponentLink1URL: https://wmsc.lcsc.com/wmsc/upload/file/pdf/v2/lcsc/2204131745_IHHEC-HOLY-STONE-ENTERPRISE-CO---LTD-C0805R105K101TDF_C2991905.pdf; ComponentLink2Description: JLCPCB Part URL; ComponentLink2URL: https://jlcpcb.com/partdetail/C2991905; ComponentLink3Description: LCSC Part URL; ComponentLink3URL: https://lcsc.com/product-detail/Multilayer-Ceramic-Capacitors-MLCC---SMD-SMT_IHHECHOLY-STONE-ENTERPRISE-CO.%2C-LTD-IHHECHOLY-STONE-ENTERPRISE-CO.%2C-LTD-C0805R105K101TDF_C2991905.html
footprint CAP-0805 (0805 (2012M) Capacitor)
pins: 1, 2

## C0805S106K025TDF
designator C?  Capacitance: 10uF  (hidden comment: *)
Capacitor, Ceramic (MLCC), 10uF, 25V, X6S, SMD 0805; Manufacturer: IHHEC(HOLY STONE ENTERPRISE CO., LTD); Manufacturer Part Number: C0805S106K025TDF; Package Size: 0805; JLCPCB Basic Part: No; JLCPCB Part Number: C2991909; Supplier 1: LCSC; Category: Capacitors - MLCC; Supplier Part Number 1: C2991909; Voltage Rating: 25V; Temperature Coefficient: X6S; RoHS: Yes; ComponentLink1Description: Datasheet; ComponentLink1URL: https://wmsc.lcsc.com/wmsc/upload/file/pdf/v2/lcsc/2204131745_IHHEC-HOLY-STONE-ENTERPRISE-CO---LTD-C0805S106K025TDF_C2991909.pdf; ComponentLink2Description: JLCPCB Part URL; ComponentLink2URL: https://jlcpcb.com/partdetail/C2991909; ComponentLink3Description: LCSC Part URL; ComponentLink3URL: https://lcsc.com/product-detail/Multilayer-Ceramic-Capacitors-MLCC---SMD-SMT_IHHECHOLY-STONE-ENTERPRISE-CO.%2C-LTD-IHHECHOLY-STONE-ENTERPRISE-CO.%2C-LTD-C0805S106K025TDF_C2991909.html
footprint CAP-0805 (0805 (2012M) Capacitor)
pins: 1, 2

## C0805X5R226K160NT
designator C?  Capacitance: 22uF  (hidden comment: *)
Capacitor, Ceramic (MLCC), 22uF, ±10%, 16V, ±10%, SMD 0805; Manufacturer: SANYEAR; Manufacturer Part Number: C0805X5R226K160NT; Package Size: 0805; JLCPCB Basic Part: No; JLCPCB Part Number: C968781; Supplier 1: LCSC; Category: Capacitors - MLCC; Supplier Part Number 1: C968781; Tolerance: ±10%; Voltage Rating: 16V; RoHS: Yes; ComponentLink1Description: Datasheet; ComponentLink2Description: JLCPCB Part URL; ComponentLink2URL: https://jlcpcb.com/partdetail/C968781; ComponentLink3Description: LCSC Part URL; ComponentLink3URL: https://lcsc.com/product-detail/Multilayer-Ceramic-Capacitors-MLCC---SMD-SMT_SANYEAR-SANYEAR-C0805X5R226K160NT_C968781.html
footprint CAP-0805 (0805 (2012M) Capacitor)
pins: 1, 2

## C0805X5R226M100NT
designator C?  Capacitance: 22uF  (hidden comment: *)
Capacitor, Ceramic (MLCC), 22uF, ±20%, 10V, X5R, ±20%, SMD 0805; Manufacturer: SANYEAR; Manufacturer Part Number: C0805X5R226M100NT; Package Size: 0805; JLCPCB Basic Part: No; JLCPCB Part Number: C466796; Supplier 1: LCSC; Category: Capacitors - MLCC; Supplier Part Number 1: C466796; Tolerance: ±20%; Voltage Rating: 10V; Temperature Coefficient: X5R; RoHS: Yes; ComponentLink1Description: Datasheet; ComponentLink1URL: https://wmsc.lcsc.com/wmsc/upload/file/pdf/v2/lcsc/2304140030_SANYEAR-C0805X5R226M100NT_C466796.pdf; ComponentLink2Description: JLCPCB Part URL; ComponentLink2URL: https://jlcpcb.com/partdetail/C466796; ComponentLink3Description: LCSC Part URL; ComponentLink3URL: https://lcsc.com/product-detail/Multilayer-Ceramic-Capacitors-MLCC---SMD-SMT_SANYEAR-SANYEAR-C0805X5R226M100NT_C466796.html
footprint CAP-0805 (0805 (2012M) Capacitor)
pins: 1, 2

## C0805X5R226M160NT
designator C?  Capacitance: 22uF  (hidden comment: *)
Capacitor, Ceramic (MLCC), 22uF, ±20%, 16V, X5R, ±20%, SMD 0805; Manufacturer: SANYEAR; Manufacturer Part Number: C0805X5R226M160NT; Package Size: 0805; JLCPCB Basic Part: No; JLCPCB Part Number: C729466; Supplier 1: LCSC; Category: Capacitors - MLCC; Supplier Part Number 1: C729466; Tolerance: ±20%; Voltage Rating: 16V; Temperature Coefficient: X5R; RoHS: Yes; ComponentLink1Description: Datasheet; ComponentLink1URL: https://wmsc.lcsc.com/wmsc/upload/file/pdf/v2/lcsc/2304140030_SANYEAR-C0805X5R226M160NT_C729466.pdf; ComponentLink2Description: JLCPCB Part URL; ComponentLink2URL: https://jlcpcb.com/partdetail/C729466; ComponentLink3Description: LCSC Part URL; ComponentLink3URL: https://lcsc.com/product-detail/Multilayer-Ceramic-Capacitors-MLCC---SMD-SMT_SANYEAR-SANYEAR-C0805X5R226M160NT_C729466.html
footprint CAP-0805 (0805 (2012M) Capacitor)
pins: 1, 2

## C0805X6S106K100NT
designator C?  Capacitance: 10uF  (hidden comment: *)
Capacitor, Ceramic (MLCC), 10uF, ±10%, 10V, ±10%, SMD 0805; Manufacturer: SANYEAR; Manufacturer Part Number: C0805X6S106K100NT; Package Size: 0805; JLCPCB Basic Part: No; JLCPCB Part Number: C2835555; Supplier 1: LCSC; Category: Capacitors - MLCC; Supplier Part Number 1: C2835555; Tolerance: ±10%; Voltage Rating: 10V; RoHS: Yes; ComponentLink1Description: Datasheet; ComponentLink1URL: https://wmsc.lcsc.com/wmsc/upload/file/pdf/v2/lcsc/2304140030_SANYEAR-C0805X6S106K100NT_C2835555.pdf; ComponentLink2Description: JLCPCB Part URL; ComponentLink2URL: https://jlcpcb.com/partdetail/C2835555; ComponentLink3Description: LCSC Part URL; ComponentLink3URL: https://lcsc.com/product-detail/Multilayer-Ceramic-Capacitors-MLCC---SMD-SMT_SANYEAR-SANYEAR-C0805X6S106K100NT_C2835555.html
footprint CAP-0805 (0805 (2012M) Capacitor)
pins: 1, 2

## C0805X6S226M6R3NT
designator C?  Capacitance: 22uF  (hidden comment: *)
Capacitor, Ceramic (MLCC), 22uF, 6.3V, SMD 0805; Manufacturer: SANYEAR; Manufacturer Part Number: C0805X6S226M6R3NT; Package Size: 0805; JLCPCB Basic Part: No; JLCPCB Part Number: C2835558; Supplier 1: LCSC; Category: Capacitors - MLCC; Supplier Part Number 1: C2835558; Voltage Rating: 6.3V; RoHS: Yes; ComponentLink1Description: Datasheet; ComponentLink1URL: https://wmsc.lcsc.com/wmsc/upload/file/pdf/v2/lcsc/2304140030_SANYEAR-C0805X6S226M6R3NT_C2835558.pdf; ComponentLink2Description: JLCPCB Part URL; ComponentLink2URL: https://jlcpcb.com/partdetail/C2835558; ComponentLink3Description: LCSC Part URL; ComponentLink3URL: https://lcsc.com/product-detail/Multilayer-Ceramic-Capacitors-MLCC---SMD-SMT_SANYEAR-SANYEAR-C0805X6S226M6R3NT_C2835558.html
footprint CAP-0805 (0805 (2012M) Capacitor)
pins: 1, 2

## C0805X6S226M100NT
designator C?  Capacitance: 22uF  (hidden comment: *)
Capacitor, Ceramic (MLCC), 22uF, ±20%, 10V, ±20%, SMD 0805; Manufacturer: SANYEAR; Manufacturer Part Number: C0805X6S226M100NT; Package Size: 0805; JLCPCB Basic Part: No; JLCPCB Part Number: C2835557; Supplier 1: LCSC; Category: Capacitors - MLCC; Supplier Part Number 1: C2835557; Tolerance: ±20%; Voltage Rating: 10V; RoHS: Yes; ComponentLink1Description: Datasheet; ComponentLink1URL: https://wmsc.lcsc.com/wmsc/upload/file/pdf/v2/lcsc/2304140030_SANYEAR-C0805X6S226M100NT_C2835557.pdf; ComponentLink2Description: JLCPCB Part URL; ComponentLink2URL: https://jlcpcb.com/partdetail/C2835557; ComponentLink3Description: LCSC Part URL; ComponentLink3URL: https://lcsc.com/product-detail/Multilayer-Ceramic-Capacitors-MLCC---SMD-SMT_SANYEAR-SANYEAR-C0805X6S226M100NT_C2835557.html
footprint CAP-0805 (0805 (2012M) Capacitor)
pins: 1, 2

## C0805X6S475K160NT
designator C?  Capacitance: 4.7uF  (hidden comment: *)
Capacitor, Ceramic (MLCC), 4.7uF, ±10%, 16V, ±10%, SMD 0805; Manufacturer: SANYEAR; Manufacturer Part Number: C0805X6S475K160NT; Package Size: 0805; JLCPCB Basic Part: No; JLCPCB Part Number: C2844305; Supplier 1: LCSC; Category: Capacitors - MLCC; Supplier Part Number 1: C2844305; Tolerance: ±10%; Voltage Rating: 16V; RoHS: Yes; ComponentLink1Description: Datasheet; ComponentLink1URL: https://wmsc.lcsc.com/wmsc/upload/file/pdf/v2/lcsc/2304140030_SANYEAR-C0805X6S475K160NT_C2844305.pdf; ComponentLink2Description: JLCPCB Part URL; ComponentLink2URL: https://jlcpcb.com/partdetail/C2844305; ComponentLink3Description: LCSC Part URL; ComponentLink3URL: https://lcsc.com/product-detail/Multilayer-Ceramic-Capacitors-MLCC---SMD-SMT_SANYEAR-SANYEAR-C0805X6S475K160NT_C2844305.html
footprint CAP-0805 (0805 (2012M) Capacitor)
pins: 1, 2

## C0805X6S475K250NT
designator C?  Capacitance: 4.7uF  (hidden comment: *)
Capacitor, Ceramic (MLCC), 4.7uF, ±10%, 25V, ±10%, SMD 0805; Manufacturer: SANYEAR; Manufacturer Part Number: C0805X6S475K250NT; Package Size: 0805; JLCPCB Basic Part: No; JLCPCB Part Number: C2844301; Supplier 1: LCSC; Category: Capacitors - MLCC; Supplier Part Number 1: C2844301; Tolerance: ±10%; Voltage Rating: 25V; RoHS: Yes; ComponentLink1Description: Datasheet; ComponentLink1URL: https://wmsc.lcsc.com/wmsc/upload/file/pdf/v2/lcsc/2304140030_SANYEAR-C0805X6S475K250NT_C2844301.pdf; ComponentLink2Description: JLCPCB Part URL; ComponentLink2URL: https://jlcpcb.com/partdetail/C2844301; ComponentLink3Description: LCSC Part URL; ComponentLink3URL: https://lcsc.com/product-detail/Multilayer-Ceramic-Capacitors-MLCC---SMD-SMT_SANYEAR-SANYEAR-C0805X6S475K250NT_C2844301.html
footprint CAP-0805 (0805 (2012M) Capacitor)
pins: 1, 2

## C0805X6S475K500NT
designator C?  Capacitance: 4.7uF  (hidden comment: *)
Capacitor, Ceramic (MLCC), 4.7uF, ±10%, 50V, ±10%, SMD 0805; Manufacturer: SANYEAR; Manufacturer Part Number: C0805X6S475K500NT; Package Size: 0805; JLCPCB Basic Part: No; JLCPCB Part Number: C2835566; Supplier 1: LCSC; Category: Capacitors - MLCC; Supplier Part Number 1: C2835566; Tolerance: ±10%; Voltage Rating: 50V; RoHS: Yes; ComponentLink1Description: Datasheet; ComponentLink1URL: https://wmsc.lcsc.com/wmsc/upload/file/pdf/v2/lcsc/2105281734_SANYEAR-C0805X6S475K500NT_C2835566.pdf; ComponentLink2Description: JLCPCB Part URL; ComponentLink2URL: https://jlcpcb.com/partdetail/C2835566; ComponentLink3Description: LCSC Part URL; ComponentLink3URL: https://lcsc.com/product-detail/Multilayer-Ceramic-Capacitors-MLCC---SMD-SMT_SANYEAR-SANYEAR-C0805X6S475K500NT_C2835566.html
footprint CAP-0805 (0805 (2012M) Capacitor)
pins: 1, 2

## C0805X6S475M350NT
designator C?  Capacitance: 4.7uF  (hidden comment: *)
Capacitor, Ceramic (MLCC), 4.7uF, ±20%, 35V, ±20%, SMD 0805; Manufacturer: SANYEAR; Manufacturer Part Number: C0805X6S475M350NT; Package Size: 0805; JLCPCB Basic Part: No; JLCPCB Part Number: C2844303; Supplier 1: LCSC; Category: Capacitors - MLCC; Supplier Part Number 1: C2844303; Tolerance: ±20%; Voltage Rating: 35V; RoHS: Yes; ComponentLink1Description: Datasheet; ComponentLink1URL: https://wmsc.lcsc.com/wmsc/upload/file/pdf/v2/lcsc/2304140030_SANYEAR-C0805X6S475M350NT_C2844303.pdf; ComponentLink2Description: JLCPCB Part URL; ComponentLink2URL: https://jlcpcb.com/partdetail/C2844303; ComponentLink3Description: LCSC Part URL; ComponentLink3URL: https://lcsc.com/product-detail/Multilayer-Ceramic-Capacitors-MLCC---SMD-SMT_SANYEAR-SANYEAR-C0805X6S475M350NT_C2844303.html
footprint CAP-0805 (0805 (2012M) Capacitor)
pins: 1, 2

## C0805X6S476M4R0NT
designator C?  Capacitance: 47uF  (hidden comment: *)
Capacitor, Ceramic (MLCC), 47uF, ±20%, 4V, ±20%, SMD 0805; Manufacturer: SANYEAR; Manufacturer Part Number: C0805X6S476M4R0NT; Package Size: 0805; JLCPCB Basic Part: No; JLCPCB Part Number: C2844386; Supplier 1: LCSC; Category: Capacitors - MLCC; Supplier Part Number 1: C2844386; Tolerance: ±20%; Voltage Rating: 4V; RoHS: Yes; ComponentLink1Description: Datasheet; ComponentLink1URL: https://wmsc.lcsc.com/wmsc/upload/file/pdf/v2/lcsc/2304140030_SANYEAR-C0805X6S476M4R0NT_C2844386.pdf; ComponentLink2Description: JLCPCB Part URL; ComponentLink2URL: https://jlcpcb.com/partdetail/C2844386; ComponentLink3Description: LCSC Part URL; ComponentLink3URL: https://lcsc.com/product-detail/Multilayer-Ceramic-Capacitors-MLCC---SMD-SMT_SANYEAR-SANYEAR-C0805X6S476M4R0NT_C2844386.html
footprint CAP-0805 (0805 (2012M) Capacitor)
pins: 1, 2

## C0805X6S476M6R3NT
designator C?  Capacitance: 47uF  (hidden comment: *)
Capacitor, Ceramic (MLCC), 47uF, 6.3V, SMD 0805; Manufacturer: SANYEAR; Manufacturer Part Number: C0805X6S476M6R3NT; Package Size: 0805; JLCPCB Basic Part: No; JLCPCB Part Number: C2835553; Supplier 1: LCSC; Category: Capacitors - MLCC; Supplier Part Number 1: C2835553; Voltage Rating: 6.3V; RoHS: Yes; ComponentLink1Description: Datasheet; ComponentLink1URL: https://wmsc.lcsc.com/wmsc/upload/file/pdf/v2/lcsc/2304140030_SANYEAR-C0805X6S476M6R3NT_C2835553.pdf; ComponentLink2Description: JLCPCB Part URL; ComponentLink2URL: https://jlcpcb.com/partdetail/C2835553; ComponentLink3Description: LCSC Part URL; ComponentLink3URL: https://lcsc.com/product-detail/Multilayer-Ceramic-Capacitors-MLCC---SMD-SMT_SANYEAR-SANYEAR-C0805X6S476M6R3NT_C2835553.html
footprint CAP-0805 (0805 (2012M) Capacitor)
pins: 1, 2

## C0805X7R105K500NT
designator C?  Capacitance: 1uF  (hidden comment: *)
Capacitor, Ceramic (MLCC), 1uF, ±10%, 50V, X7R, ±10%, SMD 0805; Manufacturer: SANYEAR; Manufacturer Part Number: C0805X7R105K500NT; Package Size: 0805; JLCPCB Basic Part: No; JLCPCB Part Number: C466788; Supplier 1: LCSC; Category: Capacitors - MLCC; Supplier Part Number 1: C466788; Tolerance: ±10%; Voltage Rating: 50V; Temperature Coefficient: X7R; RoHS: Yes; ComponentLink1Description: Datasheet; ComponentLink1URL: https://wmsc.lcsc.com/wmsc/upload/file/pdf/v2/lcsc/2304140030_SANYEAR-C0805X7R105K500NT_C466788.pdf; ComponentLink2Description: JLCPCB Part URL; ComponentLink2URL: https://jlcpcb.com/partdetail/C466788; ComponentLink3Description: LCSC Part URL; ComponentLink3URL: https://lcsc.com/product-detail/Multilayer-Ceramic-Capacitors-MLCC---SMD-SMT_SANYEAR-SANYEAR-C0805X7R105K500NT_C466788.html
footprint CAP-0805 (0805 (2012M) Capacitor)
pins: 1, 2
